# Altium footprint library Components.PcbLib: 68 footprints (part 1 of 5)
Each footprint in its own frame and in the unit in brackets; x right, y up, seen from the top. Pads: shape width x height; smd on the part's side, far side on the other; paste and mask are expansions set on the pad; w line width, h text height; cw(c..) or ccw(c..) is an arc to the next point about the centre after c.
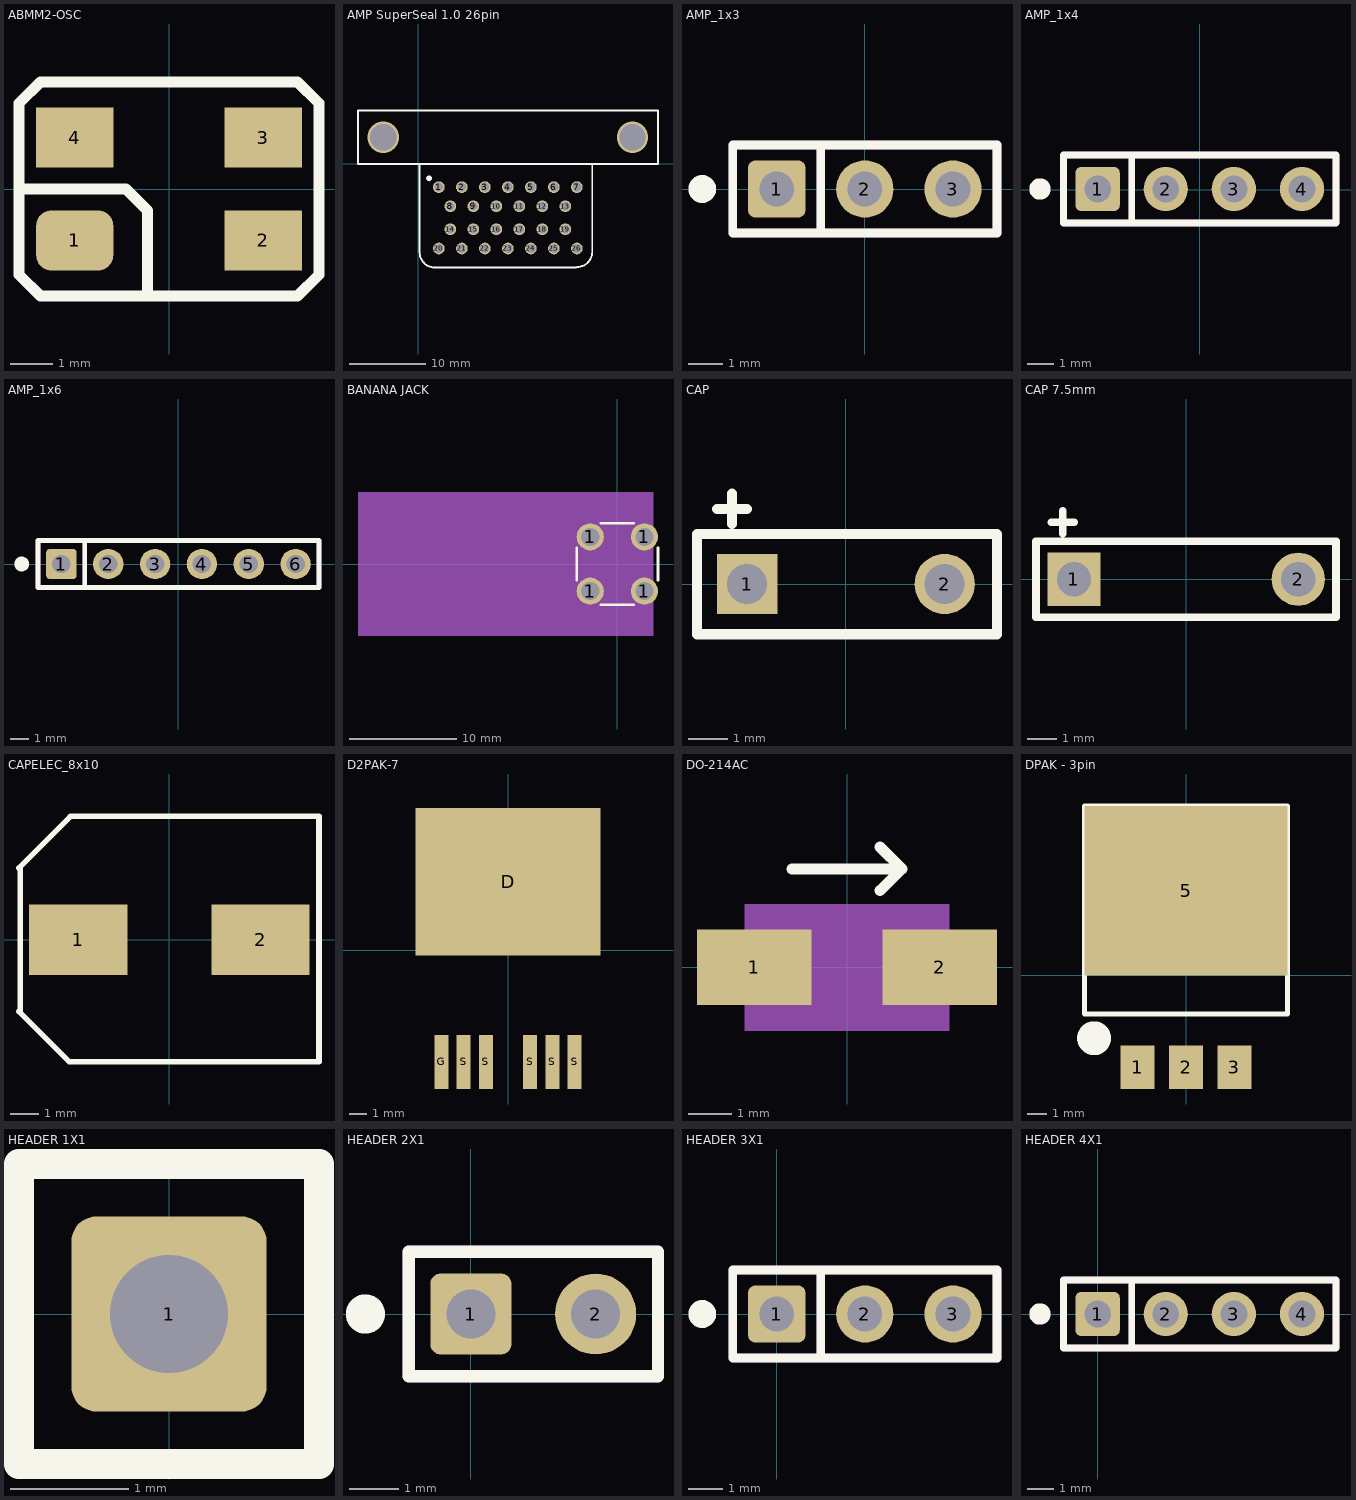
[diagram p0: the footprints below, top view; thin cyan lines are the x and y axes]

## ABMM2-OSC [mm]
pads (4):
  rrect50% 1.8x1.4 smd: 1(-2.2,-1.2)
  rect 1.8x1.4 smd: 2(2.2,-1.2) 3(2.2,1.2) 4(-2.2,1.2)
Top Overlay:
  lines w0.254: -3.5,0 -1,0 -0.5,-0.5 -0.5,-2.5 ; -3.5,-2 -3.5,2 -3,2.5 3,2.5 3.5,2 3.5,-2 3,-2.5 -3,-2.5 -3.5,-2

## AMP SuperSeal 1.0 26pin [mil]
pads (27):
  round 30 on Top Overlay: 0(55,-75)
  round 60 hole 45: 1(105,-120) 2(223.11,-120) 3(341.22,-120) 4(459.33,-120) 5(577.44,-120) 6(695.55,-120) 7(813.66,-120) 8(164.06,-218.43) 9(282.17,-218.43) 10(400.28,-218.43) 11(518.39,-218.43) 12(636.5,-218.43) 13(754.61,-218.43) 14(164.06,-336.54) 15(282.17,-336.54) 16(400.28,-336.54) 17(518.39,-336.54) 18(636.5,-336.54) 19(754.61,-336.54) 20(105,-434.96) 21(223.11,-434.96) 22(341.22,-434.96) 23(459.33,-434.96) 24(577.44,-434.96) 25(695.55,-434.96) 26(813.66,-434.96)
via 1099.1,135.9 diameter 160 hole 134
via -180.4,135.9 diameter 160 hole 134
Top Overlay:
  lines w10: 810,-533.39 85.31,-533.39 cw(c85.31,-454.65) 6.57,-454.65 6.57,-1.89 ; 813.25,-530.73 ccw(c813.25,-451.58) 892.4,-451.58 892.4,-1.89 ; 6.57,-1.89 892.4,-1.89 ; 6.57,-1.89 -310,-1.89 -310,274 0,274 1230,274 1230,-1.89 892.4,-1.89
3D body: height 1090.55, standoff -165.35, extent -317.56,-535 1237.56,902.01

## AMP_1x3 [mil]
pads (3):
  rrect25% 65x65 hole 39.37: 1(-100,0)
  round 65 hole 39.37: 2(0,0) 3(100,0)
Top Overlay:
  circle w19.68: c-184.65,0 r5.91
  lines w10: -50,-50 -50,50 -150,50 ; -150,50 150,50 150,-50 -150,-50 -150,50
Mechanical 3:
  lines w10: -50,-50 -50,50 -150,50 ; -150,50 150,50 150,-50 -150,-50 -150,50
3D body: height 395, standoff -140, extent -149,-105.49 151,124.51

## AMP_1x4 [mil]
pads (4):
  rrect25% 65x65 hole 39.37: 1(-150,1)
  round 65 hole 39.37: 2(-50,1) 3(50,1) 4(150,1)
Top Overlay:
  circle w19.68: c-234.65,1 r5.91
  lines w10: -100,-49 -100,51 -200,51 ; -200,51 -200,-49 200,-49 200,51 -200,51
Mechanical 3:
  lines w10: -100,-49 -100,51 -200,51 ; -200,51 -200,-49 200,-49 200,51 -200,51
3D body: height 395, standoff -140, extent -200.99,-103.49 199.01,126.51

## AMP_1x6 [mil]
pads (6):
  rrect25% 65x65 hole 39.37: 1(-249,1)
  round 65 hole 39.37: 2(-149,1) 3(-49,1) 4(51,1) 5(151,1) 6(251,1)
Top Overlay:
  circle w19.68: c-333.65,1 r5.91
  lines w10: -199,-49 -199,51 -299,51 ; -299,51 301,51 301,-49 -299,-49 -299,51
Mechanical 3:
  lines w10: -199,-49 -199,51 -299,51 ; -299,51 301,51 301,-49 -299,-49 -299,51
3D body: height 395, standoff -140, extent -298.99,-104.49 301.01,125.51

## BANANA JACK [mil]
pads (4):
  round 100 hole 67: 1(-100,-100) 1(-100,100) 1(100,-100) 1(100,100)
Top Overlay:
  lines w10: -150,-60 -150,60 ; -60,-150 60,-150 ; -60,150 60,150 ; 150,-60 150,60
Mechanical 1:
  rectangle: -956.5,-265 133.5,265

## CAP [mil]
pads (2):
  rect 60x60 hole 40: 1(-98.43,0)
  round 60 hole 40: 2(98.43,0)
Top Overlay:
  lines w10: -128.43,75 -98.43,75 ; -113.43,60 -113.43,90 ; -148.43,-50 -148.43,50 150.57,50 150.57,-50 -148.43,-50
3D body: height 551.18, standoff -98.43, extent -205.81,-205.82 206.7,205.82

## CAP 7.5mm [mil]
pads (2):
  rect 70x70 hole 45: 1(-147.64,0)
  round 70 hole 45: 2(147.64,0)
Top Overlay:
  lines w10: -177.64,75 -147.64,75 ; -162.64,60 -162.64,90 ; -197.64,-50 197.36,-50 197.36,50 -197.64,50 -197.64,-50
3D body: height 1653.54, standoff -98.43, extent -324.15,-324.32 324.81,324.34

## CAPELEC_8x10 [mm]
pads (2):
  rect 3.5x2.5 smd: 1(-3.25,0) 2(3.25,0)
Top Overlay:
  lines w0.2: -5.359,-2.557 -3.573,-4.343 5.258,-4.343 ; -5.359,2.557 -3.522,4.394 5.258,4.394 ; -5.309,-2.557 -5.309,2.557 ; 5.334,-4.343 5.334,4.394
3D body: height 10.5, standoff 0, extent -4.996,-4.25 5.004,4.25

## D2PAK-7 [mm]
pads (7):
  rect 10.6x8.45 smd: D(0,3.925)
  rect 0.8x3.1 smd: G(-3.81,-6.4) S(-2.54,-6.4) S(-1.27,-6.4) S(1.27,-6.4) S(2.54,-6.4) S(3.81,-6.4)
3D body: height 4.22, standoff 0, extent -4.911,-7.215 4.911,7.837

## DO-214AC [mm]
height 2.7
pads (2):
  rect 2.65x1.75 smd: 1(-2.15,0) 2(2.15,0)
Top Overlay:
  lines w0.254: -1.27,2.286 1.27,2.286 ; 0.762,1.778 1.27,2.286 ; 0.762,2.794 1.27,2.286
Mechanical 15:
  rectangle: -2.375,-1.475 2.375,1.475
3D body: height 2.37, standoff 0, extent -2.375,-1.475 2.375,1.475

## DPAK - 3pin [mil] "LT1085"
height 180
pads (4):
  rect 70x90 smd: 1(-100,-190) 2(0,-190) 3(100,-190)
  rect 420x350 smd: 5(0,175)
Top Overlay:
  circle w50: c-190,-130 r10
  lines w10: -210,-80 210,-80 210,350 -210,350 -210,-80
3D body: height 184, standoff 4, extent -207.5,-80 207.5,350

## HEADER 1X1 [mil] "PinHeader 1x1 TH Pitch 2.54mm"
height 374.02
pads (1):
  rrect25% 65x65 hole 39.37: 1(0,0)
Top Overlay:
  lines w10: -50,50 50,50 ; -50,50 -50,-50 50,-50 50,50 ; -50,50 50,50
Mechanical 3:
  lines w10: -50,50 50,50 ; -50,50 -50,-50 50,-50 50,50 ; -50,50 50,50
3D body: height 373.85, standoff -125.98, extent -50,-50 50,50

## HEADER 2X1 [mil] "PinHeader 1x2 TH Pitch 2.54mm"
height 374.02
pads (2):
  rrect25% 65x65 hole 39.37: 1(0,0)
  round 65 hole 39.37: 2(100,0)
Top Overlay:
  circle w19.68: c-84.65,0 r5.91
  lines w10: 50,50 -50,50 ; -50,50 -50,-50 150,-50 150,50 -50,50
Mechanical 3:
  lines w10: 50,50 -50,50 ; -50,50 -50,-50 150,-50 150,50 -50,50
3D body: height 373.85, standoff -125.98, extent -50,-50 150,50

## HEADER 3X1 [mil] "PinHeader 1x3 TH Pitch 2.54mm"
height 374.02
pads (3):
  rrect25% 65x65 hole 39.37: 1(0,0)
  round 65 hole 39.37: 2(100,0) 3(200,0)
Top Overlay:
  circle w19.68: c-84.65,0 r5.91
  lines w10: 50,-50 50,50 -50,50 ; -50,50 -50,-50 250,-50 250,50 -50,50
Mechanical 3:
  lines w10: 50,-50 50,50 -50,50 ; -50,50 -50,-50 250,-50 250,50 -50,50
3D body: height 373.85, standoff -125.98, extent -50,-50 250,50

## HEADER 4X1 [mil] "PinHeader 1x4 TH Pitch 2.54mm"
height 374.02
pads (4):
  rrect25% 65x65 hole 39.37: 1(0,0)
  round 65 hole 39.37: 2(100,0) 3(200,0) 4(300,0)
Top Overlay:
  circle w19.68: c-84.65,0 r5.91
  lines w10: 50,-50 50,50 -50,50 ; -50,50 -50,-50 350,-50 350,50 -50,50
Mechanical 3:
  lines w10: 50,-50 50,50 -50,50 ; -50,50 -50,-50 350,-50 350,50 -50,50
3D body: height 373.85, standoff -125.98, extent -50,-50 350,50